# Altium footprint library ST封装.PcbLib: 1336 footprints (part 88 of 109)
Each footprint in its own frame and in the unit in brackets; x right, y up, seen from the top. Pads: shape width x height; smd on the part's side, far side on the other; paste and mask are expansions set on the pad; w line width, h text height; cw(c..) or ccw(c..) is an arc to the next point about the centre after c.
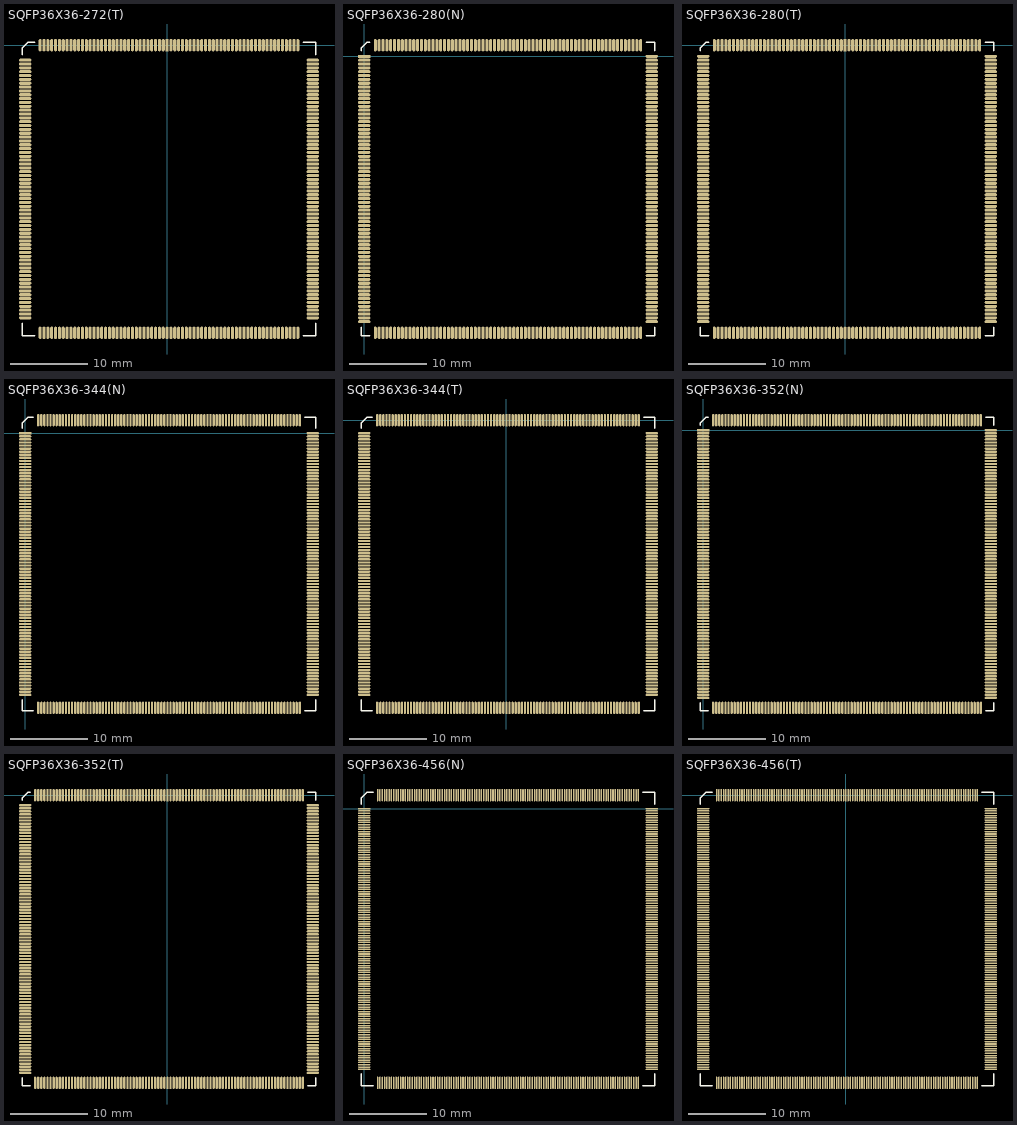
[diagram p87: the footprints below, top view; thin cyan lines are the x and y axes]

## SQFP36X36-272(T) [mm]
pads (272):
  rect 0.4x1.6 smd: 1(0,0)
  oval 0.4x1.6 smd: 2(-0.5,0) 3(-1,0) 4(-1.5,0) 5(-2,0) 6(-2.5,0) 7(-3,0) 8(-3.5,0) 9(-4,0) 10(-4.5,0) 11(-5,0) 12(-5.5,0) 13(-6,0) 14(-6.5,0) 15(-7,0) 16(-7.5,0) 17(-8,0) 18(-8.5,0) 19(-9,0) 20(-9.5,0) 21(-10,0) 22(-10.5,0) 23(-11,0) 24(-11.5,0) 25(-12,0) 26(-12.5,0) 27(-13,0) 28(-13.5,0) 29(-14,0) 30(-14.5,0) 31(-15,0) 32(-15.5,0) 33(-16,0) 34(-16.5,0) 103(-16.5,-37.4) 104(-16,-37.4) 105(-15.5,-37.4) 106(-15,-37.4) 107(-14.5,-37.4) 108(-14,-37.4) 109(-13.5,-37.4) 110(-13,-37.4) 111(-12.5,-37.4) 112(-12,-37.4) 113(-11.5,-37.4) 114(-11,-37.4) 115(-10.5,-37.4) 116(-10,-37.4) 117(-9.5,-37.4) 118(-9,-37.4) 119(-8.5,-37.4) 120(-8,-37.4) 121(-7.5,-37.4) 122(-7,-37.4) 123(-6.5,-37.4) 124(-6,-37.4) 125(-5.5,-37.4) 126(-5,-37.4) 127(-4.5,-37.4) 128(-4,-37.4) 129(-3.5,-37.4) 130(-3,-37.4) 131(-2.5,-37.4) 132(-2,-37.4) 133(-1.5,-37.4) 134(-1,-37.4) 135(-0.5,-37.4) 136(0,-37.4) 137(0.5,-37.4) 138(1,-37.4) 139(1.5,-37.4) 140(2,-37.4) 141(2.5,-37.4) 142(3,-37.4) 143(3.5,-37.4) 144(4,-37.4) 145(4.5,-37.4) 146(5,-37.4) 147(5.5,-37.4) 148(6,-37.4) 149(6.5,-37.4) 150(7,-37.4) 151(7.5,-37.4) 152(8,-37.4) 153(8.5,-37.4) 154(9,-37.4) 155(9.5,-37.4) 156(10,-37.4) 157(10.5,-37.4) 158(11,-37.4) 159(11.5,-37.4) 160(12,-37.4) 161(12.5,-37.4) 162(13,-37.4) 163(13.5,-37.4) 164(14,-37.4) 165(14.5,-37.4) 166(15,-37.4) 167(15.5,-37.4) 168(16,-37.4) 169(16.5,-37.4) 170(17,-37.4) 239(17,0) 240(16.5,0) 241(16,0) 242(15.5,0) 243(15,0) 244(14.5,0) 245(14,0) 246(13.5,0) 247(13,0) 248(12.5,0) 249(12,0) 250(11.5,0) 251(11,0) 252(10.5,0) 253(10,0) 254(9.5,0) 255(9,0) 256(8.5,0) 257(8,0) 258(7.5,0) 259(7,0) 260(6.5,0) 261(6,0) 262(5.5,0) 263(5,0) 264(4.5,0) 265(4,0) 266(3.5,0) 267(3,0) 268(2.5,0) 269(2,0) 270(1.5,0) 271(1,0) 272(0.5,0)
  oval 1.6x0.4 smd: 35(-18.45,-1.95) 36(-18.45,-2.45) 37(-18.45,-2.95) 38(-18.45,-3.45) 39(-18.45,-3.95) 40(-18.45,-4.45) 41(-18.45,-4.95) 42(-18.45,-5.45) 43(-18.45,-5.95) 44(-18.45,-6.45) 45(-18.45,-6.95) 46(-18.45,-7.45) 47(-18.45,-7.95) 48(-18.45,-8.45) 49(-18.45,-8.95) 50(-18.45,-9.45) 51(-18.45,-9.95) 52(-18.45,-10.45) 53(-18.45,-10.95) 54(-18.45,-11.45) 55(-18.45,-11.95) 56(-18.45,-12.45) 57(-18.45,-12.95) 58(-18.45,-13.45) 59(-18.45,-13.95) 60(-18.45,-14.45) 61(-18.45,-14.95) 62(-18.45,-15.45) 63(-18.45,-15.95) 64(-18.45,-16.45) 65(-18.45,-16.95) 66(-18.45,-17.45) 67(-18.45,-17.95) 68(-18.45,-18.45) 69(-18.45,-18.95) 70(-18.45,-19.45) 71(-18.45,-19.95) 72(-18.45,-20.45) 73(-18.45,-20.95) 74(-18.45,-21.45) 75(-18.45,-21.95) 76(-18.45,-22.45) 77(-18.45,-22.95) 78(-18.45,-23.45) 79(-18.45,-23.95) 80(-18.45,-24.45) 81(-18.45,-24.95) 82(-18.45,-25.45) 83(-18.45,-25.95) 84(-18.45,-26.45) 85(-18.45,-26.95) 86(-18.45,-27.45) 87(-18.45,-27.95) 88(-18.45,-28.45) 89(-18.45,-28.95) 90(-18.45,-29.45) 91(-18.45,-29.95) 92(-18.45,-30.45) 93(-18.45,-30.95) 94(-18.45,-31.45) 95(-18.45,-31.95) 96(-18.45,-32.45) 97(-18.45,-32.95) 98(-18.45,-33.45) 99(-18.45,-33.95) 100(-18.45,-34.45) 101(-18.45,-34.95) 102(-18.45,-35.45) 171(18.95,-35.45) 172(18.95,-34.95) 173(18.95,-34.45) 174(18.95,-33.95) 175(18.95,-33.45) 176(18.95,-32.95) 177(18.95,-32.45) 178(18.95,-31.95) 179(18.95,-31.45) 180(18.95,-30.95) 181(18.95,-30.45) 182(18.95,-29.95) 183(18.95,-29.45) 184(18.95,-28.95) 185(18.95,-28.45) 186(18.95,-27.95) 187(18.95,-27.45) 188(18.95,-26.95) 189(18.95,-26.45) 190(18.95,-25.95) 191(18.95,-25.45) 192(18.95,-24.95) 193(18.95,-24.45) 194(18.95,-23.95) 195(18.95,-23.45) 196(18.95,-22.95) 197(18.95,-22.45) 198(18.95,-21.95) 199(18.95,-21.45) 200(18.95,-20.95) 201(18.95,-20.45) 202(18.95,-19.95) 203(18.95,-19.45) 204(18.95,-18.95) 205(18.95,-18.45) 206(18.95,-17.95) 207(18.95,-17.45) 208(18.95,-16.95) 209(18.95,-16.45) 210(18.95,-15.95) 211(18.95,-15.45) 212(18.95,-14.95) 213(18.95,-14.45) 214(18.95,-13.95) 215(18.95,-13.45) 216(18.95,-12.95) 217(18.95,-12.45) 218(18.95,-11.95) 219(18.95,-11.45) 220(18.95,-10.95) 221(18.95,-10.45) 222(18.95,-9.95) 223(18.95,-9.45) 224(18.95,-8.95) 225(18.95,-8.45) 226(18.95,-7.95) 227(18.95,-7.45) 228(18.95,-6.95) 229(18.95,-6.45) 230(18.95,-5.95) 231(18.95,-5.45) 232(18.95,-4.95) 233(18.95,-4.45) 234(18.95,-3.95) 235(18.95,-3.45) 236(18.95,-2.95) 237(18.95,-2.45) 238(18.95,-1.95)
Top Overlay:
  lines w0.2: -18.85,-36.15 -18.85,-37.8 -17.2,-37.8 ; -18.85,-1.25 -18.85,-0.4 -18.05,0.4 -17.2,0.4 ; 17.7,-37.8 19.35,-37.8 19.35,-36.15 ; 17.7,0.4 19.35,0.4 19.35,-1.25

## SQFP36X36-280(N) [mm]
pads (280):
  rect 1.6x0.4 smd: 1(0,0)
  oval 1.6x0.4 smd: 2(0,-0.5) 3(0,-1) 4(0,-1.5) 5(0,-2) 6(0,-2.5) 7(0,-3) 8(0,-3.5) 9(0,-4) 10(0,-4.5) 11(0,-5) 12(0,-5.5) 13(0,-6) 14(0,-6.5) 15(0,-7) 16(0,-7.5) 17(0,-8) 18(0,-8.5) 19(0,-9) 20(0,-9.5) 21(0,-10) 22(0,-10.5) 23(0,-11) 24(0,-11.5) 25(0,-12) 26(0,-12.5) 27(0,-13) 28(0,-13.5) 29(0,-14) 30(0,-14.5) 31(0,-15) 32(0,-15.5) 33(0,-16) 34(0,-16.5) 35(0,-17) 36(0,-17.5) 37(0,-18) 38(0,-18.5) 39(0,-19) 40(0,-19.5) 41(0,-20) 42(0,-20.5) 43(0,-21) 44(0,-21.5) 45(0,-22) 46(0,-22.5) 47(0,-23) 48(0,-23.5) 49(0,-24) 50(0,-24.5) 51(0,-25) 52(0,-25.5) 53(0,-26) 54(0,-26.5) 55(0,-27) 56(0,-27.5) 57(0,-28) 58(0,-28.5) 59(0,-29) 60(0,-29.5) 61(0,-30) 62(0,-30.5) 63(0,-31) 64(0,-31.5) 65(0,-32) 66(0,-32.5) 67(0,-33) 68(0,-33.5) 69(0,-34) 70(0,-34.5) 141(37.4,-34.5) 142(37.4,-34) 143(37.4,-33.5) 144(37.4,-33) 145(37.4,-32.5) 146(37.4,-32) 147(37.4,-31.5) 148(37.4,-31) 149(37.4,-30.5) 150(37.4,-30) 151(37.4,-29.5) 152(37.4,-29) 153(37.4,-28.5) 154(37.4,-28) 155(37.4,-27.5) 156(37.4,-27) 157(37.4,-26.5) 158(37.4,-26) 159(37.4,-25.5) 160(37.4,-25) 161(37.4,-24.5) 162(37.4,-24) 163(37.4,-23.5) 164(37.4,-23) 165(37.4,-22.5) 166(37.4,-22) 167(37.4,-21.5) 168(37.4,-21) 169(37.4,-20.5) 170(37.4,-20) 171(37.4,-19.5) 172(37.4,-19) 173(37.4,-18.5) 174(37.4,-18) 175(37.4,-17.5) 176(37.4,-17) 177(37.4,-16.5) 178(37.4,-16) 179(37.4,-15.5) 180(37.4,-15) 181(37.4,-14.5) 182(37.4,-14) 183(37.4,-13.5) 184(37.4,-13) 185(37.4,-12.5) 186(37.4,-12) 187(37.4,-11.5) 188(37.4,-11) 189(37.4,-10.5) 190(37.4,-10) 191(37.4,-9.5) 192(37.4,-9) 193(37.4,-8.5) 194(37.4,-8) 195(37.4,-7.5) 196(37.4,-7) 197(37.4,-6.5) 198(37.4,-6) 199(37.4,-5.5) 200(37.4,-5) 201(37.4,-4.5) 202(37.4,-4) 203(37.4,-3.5) 204(37.4,-3) 205(37.4,-2.5) 206(37.4,-2) 207(37.4,-1.5) 208(37.4,-1) 209(37.4,-0.5) 210(37.4,0)
  oval 0.4x1.6 smd: 71(1.45,-35.95) 72(1.95,-35.95) 73(2.45,-35.95) 74(2.95,-35.95) 75(3.45,-35.95) 76(3.95,-35.95) 77(4.45,-35.95) 78(4.95,-35.95) 79(5.45,-35.95) 80(5.95,-35.95) 81(6.45,-35.95) 82(6.95,-35.95) 83(7.45,-35.95) 84(7.95,-35.95) 85(8.45,-35.95) 86(8.95,-35.95) 87(9.45,-35.95) 88(9.95,-35.95) 89(10.45,-35.95) 90(10.95,-35.95) 91(11.45,-35.95) 92(11.95,-35.95) 93(12.45,-35.95) 94(12.95,-35.95) 95(13.45,-35.95) 96(13.95,-35.95) 97(14.45,-35.95) 98(14.95,-35.95) 99(15.45,-35.95) 100(15.95,-35.95) 101(16.45,-35.95) 102(16.95,-35.95) 103(17.45,-35.95) 104(17.95,-35.95) 105(18.45,-35.95) 106(18.95,-35.95) 107(19.45,-35.95) 108(19.95,-35.95) 109(20.45,-35.95) 110(20.95,-35.95) 111(21.45,-35.95) 112(21.95,-35.95) 113(22.45,-35.95) 114(22.95,-35.95) 115(23.45,-35.95) 116(23.95,-35.95) 117(24.45,-35.95) 118(24.95,-35.95) 119(25.45,-35.95) 120(25.95,-35.95) 121(26.45,-35.95) 122(26.95,-35.95) 123(27.45,-35.95) 124(27.95,-35.95) 125(28.45,-35.95) 126(28.95,-35.95) 127(29.45,-35.95) 128(29.95,-35.95) 129(30.45,-35.95) 130(30.95,-35.95) 131(31.45,-35.95) 132(31.95,-35.95) 133(32.45,-35.95) 134(32.95,-35.95) 135(33.45,-35.95) 136(33.95,-35.95) 137(34.45,-35.95) 138(34.95,-35.95) 139(35.45,-35.95) 140(35.95,-35.95) 211(35.95,1.45) 212(35.45,1.45) 213(34.95,1.45) 214(34.45,1.45) 215(33.95,1.45) 216(33.45,1.45) 217(32.95,1.45) 218(32.45,1.45) 219(31.95,1.45) 220(31.45,1.45) 221(30.95,1.45) 222(30.45,1.45) 223(29.95,1.45) 224(29.45,1.45) 225(28.95,1.45) 226(28.45,1.45) 227(27.95,1.45) 228(27.45,1.45) 229(26.95,1.45) 230(26.45,1.45) 231(25.95,1.45) 232(25.45,1.45) 233(24.95,1.45) 234(24.45,1.45) 235(23.95,1.45) 236(23.45,1.45) 237(22.95,1.45) 238(22.45,1.45) 239(21.95,1.45) 240(21.45,1.45) 241(20.95,1.45) 242(20.45,1.45) 243(19.95,1.45) 244(19.45,1.45) 245(18.95,1.45) 246(18.45,1.45) 247(17.95,1.45) 248(17.45,1.45) 249(16.95,1.45) 250(16.45,1.45) 251(15.95,1.45) 252(15.45,1.45) 253(14.95,1.45) 254(14.45,1.45) 255(13.95,1.45) 256(13.45,1.45) 257(12.95,1.45) 258(12.45,1.45) 259(11.95,1.45) 260(11.45,1.45) 261(10.95,1.45) 262(10.45,1.45) 263(9.95,1.45) 264(9.45,1.45) 265(8.95,1.45) 266(8.45,1.45) 267(7.95,1.45) 268(7.45,1.45) 269(6.95,1.45) 270(6.45,1.45) 271(5.95,1.45) 272(5.45,1.45) 273(4.95,1.45) 274(4.45,1.45) 275(3.95,1.45) 276(3.45,1.45) 277(2.95,1.45) 278(2.45,1.45) 279(1.95,1.45) 280(1.45,1.45)
Top Overlay:
  lines w0.2: -0.4,-35.2 -0.4,-36.35 0.75,-36.35 ; -0.4,0.7 -0.4,1.05 0.4,1.85 0.75,1.85 ; 36.65,-36.35 37.8,-36.35 37.8,-35.2 ; 36.65,1.85 37.8,1.85 37.8,0.7

## SQFP36X36-280(T) [mm]
pads (280):
  rect 0.4x1.6 smd: 1(0,0)
  oval 0.4x1.6 smd: 2(-0.5,0) 3(-1,0) 4(-1.5,0) 5(-2,0) 6(-2.5,0) 7(-3,0) 8(-3.5,0) 9(-4,0) 10(-4.5,0) 11(-5,0) 12(-5.5,0) 13(-6,0) 14(-6.5,0) 15(-7,0) 16(-7.5,0) 17(-8,0) 18(-8.5,0) 19(-9,0) 20(-9.5,0) 21(-10,0) 22(-10.5,0) 23(-11,0) 24(-11.5,0) 25(-12,0) 26(-12.5,0) 27(-13,0) 28(-13.5,0) 29(-14,0) 30(-14.5,0) 31(-15,0) 32(-15.5,0) 33(-16,0) 34(-16.5,0) 35(-17,0) 106(-17,-37.4) 107(-16.5,-37.4) 108(-16,-37.4) 109(-15.5,-37.4) 110(-15,-37.4) 111(-14.5,-37.4) 112(-14,-37.4) 113(-13.5,-37.4) 114(-13,-37.4) 115(-12.5,-37.4) 116(-12,-37.4) 117(-11.5,-37.4) 118(-11,-37.4) 119(-10.5,-37.4) 120(-10,-37.4) 121(-9.5,-37.4) 122(-9,-37.4) 123(-8.5,-37.4) 124(-8,-37.4) 125(-7.5,-37.4) 126(-7,-37.4) 127(-6.5,-37.4) 128(-6,-37.4) 129(-5.5,-37.4) 130(-5,-37.4) 131(-4.5,-37.4) 132(-4,-37.4) 133(-3.5,-37.4) 134(-3,-37.4) 135(-2.5,-37.4) 136(-2,-37.4) 137(-1.5,-37.4) 138(-1,-37.4) 139(-0.5,-37.4) 140(0,-37.4) 141(0.5,-37.4) 142(1,-37.4) 143(1.5,-37.4) 144(2,-37.4) 145(2.5,-37.4) 146(3,-37.4) 147(3.5,-37.4) 148(4,-37.4) 149(4.5,-37.4) 150(5,-37.4) 151(5.5,-37.4) 152(6,-37.4) 153(6.5,-37.4) 154(7,-37.4) 155(7.5,-37.4) 156(8,-37.4) 157(8.5,-37.4) 158(9,-37.4) 159(9.5,-37.4) 160(10,-37.4) 161(10.5,-37.4) 162(11,-37.4) 163(11.5,-37.4) 164(12,-37.4) 165(12.5,-37.4) 166(13,-37.4) 167(13.5,-37.4) 168(14,-37.4) 169(14.5,-37.4) 170(15,-37.4) 171(15.5,-37.4) 172(16,-37.4) 173(16.5,-37.4) 174(17,-37.4) 175(17.5,-37.4) 246(17.5,0) 247(17,0) 248(16.5,0) 249(16,0) 250(15.5,0) 251(15,0) 252(14.5,0) 253(14,0) 254(13.5,0) 255(13,0) 256(12.5,0) 257(12,0) 258(11.5,0) 259(11,0) 260(10.5,0) 261(10,0) 262(9.5,0) 263(9,0) 264(8.5,0) 265(8,0) 266(7.5,0) 267(7,0) 268(6.5,0) 269(6,0) 270(5.5,0) 271(5,0) 272(4.5,0) 273(4,0) 274(3.5,0) 275(3,0) 276(2.5,0) 277(2,0) 278(1.5,0) 279(1,0) 280(0.5,0)
  oval 1.6x0.4 smd: 36(-18.45,-1.45) 37(-18.45,-1.95) 38(-18.45,-2.45) 39(-18.45,-2.95) 40(-18.45,-3.45) 41(-18.45,-3.95) 42(-18.45,-4.45) 43(-18.45,-4.95) 44(-18.45,-5.45) 45(-18.45,-5.95) 46(-18.45,-6.45) 47(-18.45,-6.95) 48(-18.45,-7.45) 49(-18.45,-7.95) 50(-18.45,-8.45) 51(-18.45,-8.95) 52(-18.45,-9.45) 53(-18.45,-9.95) 54(-18.45,-10.45) 55(-18.45,-10.95) 56(-18.45,-11.45) 57(-18.45,-11.95) 58(-18.45,-12.45) 59(-18.45,-12.95) 60(-18.45,-13.45) 61(-18.45,-13.95) 62(-18.45,-14.45) 63(-18.45,-14.95) 64(-18.45,-15.45) 65(-18.45,-15.95) 66(-18.45,-16.45) 67(-18.45,-16.95) 68(-18.45,-17.45) 69(-18.45,-17.95) 70(-18.45,-18.45) 71(-18.45,-18.95) 72(-18.45,-19.45) 73(-18.45,-19.95) 74(-18.45,-20.45) 75(-18.45,-20.95) 76(-18.45,-21.45) 77(-18.45,-21.95) 78(-18.45,-22.45) 79(-18.45,-22.95) 80(-18.45,-23.45) 81(-18.45,-23.95) 82(-18.45,-24.45) 83(-18.45,-24.95) 84(-18.45,-25.45) 85(-18.45,-25.95) 86(-18.45,-26.45) 87(-18.45,-26.95) 88(-18.45,-27.45) 89(-18.45,-27.95) 90(-18.45,-28.45) 91(-18.45,-28.95) 92(-18.45,-29.45) 93(-18.45,-29.95) 94(-18.45,-30.45) 95(-18.45,-30.95) 96(-18.45,-31.45) 97(-18.45,-31.95) 98(-18.45,-32.45) 99(-18.45,-32.95) 100(-18.45,-33.45) 101(-18.45,-33.95) 102(-18.45,-34.45) 103(-18.45,-34.95) 104(-18.45,-35.45) 105(-18.45,-35.95) 176(18.95,-35.95) 177(18.95,-35.45) 178(18.95,-34.95) 179(18.95,-34.45) 180(18.95,-33.95) 181(18.95,-33.45) 182(18.95,-32.95) 183(18.95,-32.45) 184(18.95,-31.95) 185(18.95,-31.45) 186(18.95,-30.95) 187(18.95,-30.45) 188(18.95,-29.95) 189(18.95,-29.45) 190(18.95,-28.95) 191(18.95,-28.45) 192(18.95,-27.95) 193(18.95,-27.45) 194(18.95,-26.95) 195(18.95,-26.45) 196(18.95,-25.95) 197(18.95,-25.45) 198(18.95,-24.95) 199(18.95,-24.45) 200(18.95,-23.95) 201(18.95,-23.45) 202(18.95,-22.95) 203(18.95,-22.45) 204(18.95,-21.95) 205(18.95,-21.45) 206(18.95,-20.95) 207(18.95,-20.45) 208(18.95,-19.95) 209(18.95,-19.45) 210(18.95,-18.95) 211(18.95,-18.45) 212(18.95,-17.95) 213(18.95,-17.45) 214(18.95,-16.95) 215(18.95,-16.45) 216(18.95,-15.95) 217(18.95,-15.45) 218(18.95,-14.95) 219(18.95,-14.45) 220(18.95,-13.95) 221(18.95,-13.45) 222(18.95,-12.95) 223(18.95,-12.45) 224(18.95,-11.95) 225(18.95,-11.45) 226(18.95,-10.95) 227(18.95,-10.45) 228(18.95,-9.95) 229(18.95,-9.45) 230(18.95,-8.95) 231(18.95,-8.45) 232(18.95,-7.95) 233(18.95,-7.45) 234(18.95,-6.95) 235(18.95,-6.45) 236(18.95,-5.95) 237(18.95,-5.45) 238(18.95,-4.95) 239(18.95,-4.45) 240(18.95,-3.95) 241(18.95,-3.45) 242(18.95,-2.95) 243(18.95,-2.45) 244(18.95,-1.95) 245(18.95,-1.45)
Top Overlay:
  lines w0.2: -18.85,-36.65 -18.85,-37.8 -17.7,-37.8 ; -18.85,-0.75 -18.85,-0.4 -18.05,0.4 -17.7,0.4 ; 18.2,-37.8 19.35,-37.8 19.35,-36.65 ; 18.2,0.4 19.35,0.4 19.35,-0.75

## SQFP36X36-344(N) [mm]
pads (344):
  rect 1.6x0.3 smd: 1(0,0)
  oval 1.6x0.3 smd: 2(0,-0.4) 3(0,-0.8) 4(0,-1.2) 5(0,-1.6) 6(0,-2) 7(0,-2.4) 8(0,-2.8) 9(0,-3.2) 10(0,-3.6) 11(0,-4) 12(0,-4.4) 13(0,-4.8) 14(0,-5.2) 15(0,-5.6) 16(0,-6) 17(0,-6.4) 18(0,-6.8) 19(0,-7.2) 20(0,-7.6) 21(0,-8) 22(0,-8.4) 23(0,-8.8) 24(0,-9.2) 25(0,-9.6) 26(0,-10) 27(0,-10.4) 28(0,-10.8) 29(0,-11.2) 30(0,-11.6) 31(0,-12) 32(0,-12.4) 33(0,-12.8) 34(0,-13.2) 35(0,-13.6) 36(0,-14) 37(0,-14.4) 38(0,-14.8) 39(0,-15.2) 40(0,-15.6) 41(0,-16) 42(0,-16.4) 43(0,-16.8) 44(0,-17.2) 45(0,-17.6) 46(0,-18) 47(0,-18.4) 48(0,-18.8) 49(0,-19.2) 50(0,-19.6) 51(0,-20) 52(0,-20.4) 53(0,-20.8) 54(0,-21.2) 55(0,-21.6) 56(0,-22) 57(0,-22.4) 58(0,-22.8) 59(0,-23.2) 60(0,-23.6) 61(0,-24) 62(0,-24.4) 63(0,-24.8) 64(0,-25.2) 65(0,-25.6) 66(0,-26) 67(0,-26.4) 68(0,-26.8) 69(0,-27.2) 70(0,-27.6) 71(0,-28) 72(0,-28.4) 73(0,-28.8) 74(0,-29.2) 75(0,-29.6) 76(0,-30) 77(0,-30.4) 78(0,-30.8) 79(0,-31.2) 80(0,-31.6) 81(0,-32) 82(0,-32.4) 83(0,-32.8) 84(0,-33.2) 85(0,-33.6) 86(0,-34) 173(37.4,-34) 174(37.4,-33.6) 175(37.4,-33.2) 176(37.4,-32.8) 177(37.4,-32.4) 178(37.4,-32) 179(37.4,-31.6) 180(37.4,-31.2) 181(37.4,-30.8) 182(37.4,-30.4) 183(37.4,-30) 184(37.4,-29.6) 185(37.4,-29.2) 186(37.4,-28.8) 187(37.4,-28.4) 188(37.4,-28) 189(37.4,-27.6) 190(37.4,-27.2) 191(37.4,-26.8) 192(37.4,-26.4) 193(37.4,-26) 194(37.4,-25.6) 195(37.4,-25.2) 196(37.4,-24.8) 197(37.4,-24.4) 198(37.4,-24) 199(37.4,-23.6) 200(37.4,-23.2) 201(37.4,-22.8) 202(37.4,-22.4) 203(37.4,-22) 204(37.4,-21.6) 205(37.4,-21.2) 206(37.4,-20.8) 207(37.4,-20.4) 208(37.4,-20) 209(37.4,-19.6) 210(37.4,-19.2) 211(37.4,-18.8) 212(37.4,-18.4) 213(37.4,-18) 214(37.4,-17.6) 215(37.4,-17.2) 216(37.4,-16.8) 217(37.4,-16.4) 218(37.4,-16) 219(37.4,-15.6) 220(37.4,-15.2) 221(37.4,-14.8) 222(37.4,-14.4) 223(37.4,-14) 224(37.4,-13.6) 225(37.4,-13.2) 226(37.4,-12.8) 227(37.4,-12.4) 228(37.4,-12) 229(37.4,-11.6) 230(37.4,-11.2) 231(37.4,-10.8) 232(37.4,-10.4) 233(37.4,-10) 234(37.4,-9.6) 235(37.4,-9.2) 236(37.4,-8.8) 237(37.4,-8.4) 238(37.4,-8) 239(37.4,-7.6) 240(37.4,-7.2) 241(37.4,-6.8) 242(37.4,-6.4) 243(37.4,-6) 244(37.4,-5.6) 245(37.4,-5.2) 246(37.4,-4.8) 247(37.4,-4.4) 248(37.4,-4) 249(37.4,-3.6) 250(37.4,-3.2) 251(37.4,-2.8) 252(37.4,-2.4) 253(37.4,-2) 254(37.4,-1.6) 255(37.4,-1.2) 256(37.4,-0.8) 257(37.4,-0.4) 258(37.4,0)
  oval 0.3x1.6 smd: 87(1.7,-35.7) 88(2.1,-35.7) 89(2.5,-35.7) 90(2.9,-35.7) 91(3.3,-35.7) 92(3.7,-35.7) 93(4.1,-35.7) 94(4.5,-35.7) 95(4.9,-35.7) 96(5.3,-35.7) 97(5.7,-35.7) 98(6.1,-35.7) 99(6.5,-35.7) 100(6.9,-35.7) 101(7.3,-35.7) 102(7.7,-35.7) 103(8.1,-35.7) 104(8.5,-35.7) 105(8.9,-35.7) 106(9.3,-35.7) 107(9.7,-35.7) 108(10.1,-35.7) 109(10.5,-35.7) 110(10.9,-35.7) 111(11.3,-35.7) 112(11.7,-35.7) 113(12.1,-35.7) 114(12.5,-35.7) 115(12.9,-35.7) 116(13.3,-35.7) 117(13.7,-35.7) 118(14.1,-35.7) 119(14.5,-35.7) 120(14.9,-35.7) 121(15.3,-35.7) 122(15.7,-35.7) 123(16.1,-35.7) 124(16.5,-35.7) 125(16.9,-35.7) 126(17.3,-35.7) 127(17.7,-35.7) 128(18.1,-35.7) 129(18.5,-35.7) 130(18.9,-35.7) 131(19.3,-35.7) 132(19.7,-35.7) 133(20.1,-35.7) 134(20.5,-35.7) 135(20.9,-35.7) 136(21.3,-35.7) 137(21.7,-35.7) 138(22.1,-35.7) 139(22.5,-35.7) 140(22.9,-35.7) 141(23.3,-35.7) 142(23.7,-35.7) 143(24.1,-35.7) 144(24.5,-35.7) 145(24.9,-35.7) 146(25.3,-35.7) 147(25.7,-35.7) 148(26.1,-35.7) 149(26.5,-35.7) 150(26.9,-35.7) 151(27.3,-35.7) 152(27.7,-35.7) 153(28.1,-35.7) 154(28.5,-35.7) 155(28.9,-35.7) 156(29.3,-35.7) 157(29.7,-35.7) 158(30.1,-35.7) 159(30.5,-35.7) 160(30.9,-35.7) 161(31.3,-35.7) 162(31.7,-35.7) 163(32.1,-35.7) 164(32.5,-35.7) 165(32.9,-35.7) 166(33.3,-35.7) 167(33.7,-35.7) 168(34.1,-35.7) 169(34.5,-35.7) 170(34.9,-35.7) 171(35.3,-35.7) 172(35.7,-35.7) 259(35.7,1.7) 260(35.3,1.7) 261(34.9,1.7) 262(34.5,1.7) 263(34.1,1.7) 264(33.7,1.7) 265(33.3,1.7) 266(32.9,1.7) 267(32.5,1.7) 268(32.1,1.7) 269(31.7,1.7) 270(31.3,1.7) 271(30.9,1.7) 272(30.5,1.7) 273(30.1,1.7) 274(29.7,1.7) 275(29.3,1.7) 276(28.9,1.7) 277(28.5,1.7) 278(28.1,1.7) 279(27.7,1.7) 280(27.3,1.7) 281(26.9,1.7) 282(26.5,1.7) 283(26.1,1.7) 284(25.7,1.7) 285(25.3,1.7) 286(24.9,1.7) 287(24.5,1.7) 288(24.1,1.7) 289(23.7,1.7) 290(23.3,1.7) 291(22.9,1.7) 292(22.5,1.7) 293(22.1,1.7) 294(21.7,1.7) 295(21.3,1.7) 296(20.9,1.7) 297(20.5,1.7) 298(20.1,1.7) 299(19.7,1.7) 300(19.3,1.7) 301(18.9,1.7) 302(18.5,1.7) 303(18.1,1.7) 304(17.7,1.7) 305(17.3,1.7) 306(16.9,1.7) 307(16.5,1.7) 308(16.1,1.7) 309(15.7,1.7) 310(15.3,1.7) 311(14.9,1.7) 312(14.5,1.7) 313(14.1,1.7) 314(13.7,1.7) 315(13.3,1.7) 316(12.9,1.7) 317(12.5,1.7) 318(12.1,1.7) 319(11.7,1.7) 320(11.3,1.7) 321(10.9,1.7) 322(10.5,1.7) 323(10.1,1.7) 324(9.7,1.7) 325(9.3,1.7) 326(8.9,1.7) 327(8.5,1.7) 328(8.1,1.7) 329(7.7,1.7) 330(7.3,1.7) 331(6.9,1.7) 332(6.5,1.7) 333(6.1,1.7) 334(5.7,1.7) 335(5.3,1.7) 336(4.9,1.7) 337(4.5,1.7) 338(4.1,1.7) 339(3.7,1.7) 340(3.3,1.7) 341(2.9,1.7) 342(2.5,1.7) 343(2.1,1.7) 344(1.7,1.7)
Top Overlay:
  lines w0.2: -0.4,-34.65 -0.4,-36.1 1.05,-36.1 ; -0.4,0.65 -0.4,1.3 0.4,2.1 1.05,2.1 ; 36.35,-36.1 37.8,-36.1 37.8,-34.65 ; 36.35,2.1 37.8,2.1 37.8,0.65

## SQFP36X36-344(T) [mm]
pads (344):
  rect 0.3x1.6 smd: 1(0,0)
  oval 0.3x1.6 smd: 2(-0.4,0) 3(-0.8,0) 4(-1.2,0) 5(-1.6,0) 6(-2,0) 7(-2.4,0) 8(-2.8,0) 9(-3.2,0) 10(-3.6,0) 11(-4,0) 12(-4.4,0) 13(-4.8,0) 14(-5.2,0) 15(-5.6,0) 16(-6,0) 17(-6.4,0) 18(-6.8,0) 19(-7.2,0) 20(-7.6,0) 21(-8,0) 22(-8.4,0) 23(-8.8,0) 24(-9.2,0) 25(-9.6,0) 26(-10,0) 27(-10.4,0) 28(-10.8,0) 29(-11.2,0) 30(-11.6,0) 31(-12,0) 32(-12.4,0) 33(-12.8,0) 34(-13.2,0) 35(-13.6,0) 36(-14,0) 37(-14.4,0) 38(-14.8,0) 39(-15.2,0) 40(-15.6,0) 41(-16,0) 42(-16.4,0) 43(-16.8,0) 130(-16.8,-37.4) 131(-16.4,-37.4) 132(-16,-37.4) 133(-15.6,-37.4) 134(-15.2,-37.4) 135(-14.8,-37.4) 136(-14.4,-37.4) 137(-14,-37.4) 138(-13.6,-37.4) 139(-13.2,-37.4) 140(-12.8,-37.4) 141(-12.4,-37.4) 142(-12,-37.4) 143(-11.6,-37.4) 144(-11.2,-37.4) 145(-10.8,-37.4) 146(-10.4,-37.4) 147(-10,-37.4) 148(-9.6,-37.4) 149(-9.2,-37.4) 150(-8.8,-37.4) 151(-8.4,-37.4) 152(-8,-37.4) 153(-7.6,-37.4) 154(-7.2,-37.4) 155(-6.8,-37.4) 156(-6.4,-37.4) 157(-6,-37.4) 158(-5.6,-37.4) 159(-5.2,-37.4) 160(-4.8,-37.4) 161(-4.4,-37.4) 162(-4,-37.4) 163(-3.6,-37.4) 164(-3.2,-37.4) 165(-2.8,-37.4) 166(-2.4,-37.4) 167(-2,-37.4) 168(-1.6,-37.4) 169(-1.2,-37.4) 170(-0.8,-37.4) 171(-0.4,-37.4) 172(0,-37.4) 173(0.4,-37.4) 174(0.8,-37.4) 175(1.2,-37.4) 176(1.6,-37.4) 177(2,-37.4) 178(2.4,-37.4) 179(2.8,-37.4) 180(3.2,-37.4) 181(3.6,-37.4) 182(4,-37.4) 183(4.4,-37.4) 184(4.8,-37.4) 185(5.2,-37.4) 186(5.6,-37.4) 187(6,-37.4) 188(6.4,-37.4) 189(6.8,-37.4) 190(7.2,-37.4) 191(7.6,-37.4) 192(8,-37.4) 193(8.4,-37.4) 194(8.8,-37.4) 195(9.2,-37.4) 196(9.6,-37.4) 197(10,-37.4) 198(10.4,-37.4) 199(10.8,-37.4) 200(11.2,-37.4) 201(11.6,-37.4) 202(12,-37.4) 203(12.4,-37.4) 204(12.8,-37.4) 205(13.2,-37.4) 206(13.6,-37.4) 207(14,-37.4) 208(14.4,-37.4) 209(14.8,-37.4) 210(15.2,-37.4) 211(15.6,-37.4) 212(16,-37.4) 213(16.4,-37.4) 214(16.8,-37.4) 215(17.2,-37.4) 302(17.2,0) 303(16.8,0) 304(16.4,0) 305(16,0) 306(15.6,0) 307(15.2,0) 308(14.8,0) 309(14.4,0) 310(14,0) 311(13.6,0) 312(13.2,0) 313(12.8,0) 314(12.4,0) 315(12,0) 316(11.6,0) 317(11.2,0) 318(10.8,0) 319(10.4,0) 320(10,0) 321(9.6,0) 322(9.2,0) 323(8.8,0) 324(8.4,0) 325(8,0) 326(7.6,0) 327(7.2,0) 328(6.8,0) 329(6.4,0) 330(6,0) 331(5.6,0) 332(5.2,0) 333(4.8,0) 334(4.4,0) 335(4,0) 336(3.6,0) 337(3.2,0) 338(2.8,0) 339(2.4,0) 340(2,0) 341(1.6,0) 342(1.2,0) 343(0.8,0) 344(0.4,0)
  oval 1.6x0.3 smd: 44(-18.5,-1.7) 45(-18.5,-2.1) 46(-18.5,-2.5) 47(-18.5,-2.9) 48(-18.5,-3.3) 49(-18.5,-3.7) 50(-18.5,-4.1) 51(-18.5,-4.5) 52(-18.5,-4.9) 53(-18.5,-5.3) 54(-18.5,-5.7) 55(-18.5,-6.1) 56(-18.5,-6.5) 57(-18.5,-6.9) 58(-18.5,-7.3) 59(-18.5,-7.7) 60(-18.5,-8.1) 61(-18.5,-8.5) 62(-18.5,-8.9) 63(-18.5,-9.3) 64(-18.5,-9.7) 65(-18.5,-10.1) 66(-18.5,-10.5) 67(-18.5,-10.9) 68(-18.5,-11.3) 69(-18.5,-11.7) 70(-18.5,-12.1) 71(-18.5,-12.5) 72(-18.5,-12.9) 73(-18.5,-13.3) 74(-18.5,-13.7) 75(-18.5,-14.1) 76(-18.5,-14.5) 77(-18.5,-14.9) 78(-18.5,-15.3) 79(-18.5,-15.7) 80(-18.5,-16.1) 81(-18.5,-16.5) 82(-18.5,-16.9) 83(-18.5,-17.3) 84(-18.5,-17.7) 85(-18.5,-18.1) 86(-18.5,-18.5) 87(-18.5,-18.9) 88(-18.5,-19.3) 89(-18.5,-19.7) 90(-18.5,-20.1) 91(-18.5,-20.5) 92(-18.5,-20.9) 93(-18.5,-21.3) 94(-18.5,-21.7) 95(-18.5,-22.1) 96(-18.5,-22.5) 97(-18.5,-22.9) 98(-18.5,-23.3) 99(-18.5,-23.7) 100(-18.5,-24.1) 101(-18.5,-24.5) 102(-18.5,-24.9) 103(-18.5,-25.3) 104(-18.5,-25.7) 105(-18.5,-26.1) 106(-18.5,-26.5) 107(-18.5,-26.9) 108(-18.5,-27.3) 109(-18.5,-27.7) 110(-18.5,-28.1) 111(-18.5,-28.5) 112(-18.5,-28.9) 113(-18.5,-29.3) 114(-18.5,-29.7) 115(-18.5,-30.1) 116(-18.5,-30.5) 117(-18.5,-30.9) 118(-18.5,-31.3) 119(-18.5,-31.7) 120(-18.5,-32.1) 121(-18.5,-32.5) 122(-18.5,-32.9) 123(-18.5,-33.3) 124(-18.5,-33.7) 125(-18.5,-34.1) 126(-18.5,-34.5) 127(-18.5,-34.9) 128(-18.5,-35.3) 129(-18.5,-35.7) 216(18.9,-35.7) 217(18.9,-35.3) 218(18.9,-34.9) 219(18.9,-34.5) 220(18.9,-34.1) 221(18.9,-33.7) 222(18.9,-33.3) 223(18.9,-32.9) 224(18.9,-32.5) 225(18.9,-32.1) 226(18.9,-31.7) 227(18.9,-31.3) 228(18.9,-30.9) 229(18.9,-30.5) 230(18.9,-30.1) 231(18.9,-29.7) 232(18.9,-29.3) 233(18.9,-28.9) 234(18.9,-28.5) 235(18.9,-28.1) 236(18.9,-27.7) 237(18.9,-27.3) 238(18.9,-26.9) 239(18.9,-26.5) 240(18.9,-26.1) 241(18.9,-25.7) 242(18.9,-25.3) 243(18.9,-24.9) 244(18.9,-24.5) 245(18.9,-24.1) 246(18.9,-23.7) 247(18.9,-23.3) 248(18.9,-22.9) 249(18.9,-22.5) 250(18.9,-22.1) 251(18.9,-21.7) 252(18.9,-21.3) 253(18.9,-20.9) 254(18.9,-20.5) 255(18.9,-20.1) 256(18.9,-19.7) 257(18.9,-19.3) 258(18.9,-18.9) 259(18.9,-18.5) 260(18.9,-18.1) 261(18.9,-17.7) 262(18.9,-17.3) 263(18.9,-16.9) 264(18.9,-16.5) 265(18.9,-16.1) 266(18.9,-15.7) 267(18.9,-15.3) 268(18.9,-14.9) 269(18.9,-14.5) 270(18.9,-14.1) 271(18.9,-13.7) 272(18.9,-13.3) 273(18.9,-12.9) 274(18.9,-12.5) 275(18.9,-12.1) 276(18.9,-11.7) 277(18.9,-11.3) 278(18.9,-10.9) 279(18.9,-10.5) 280(18.9,-10.1) 281(18.9,-9.7) 282(18.9,-9.3) 283(18.9,-8.9) 284(18.9,-8.5) 285(18.9,-8.1) 286(18.9,-7.7) 287(18.9,-7.3) 288(18.9,-6.9) 289(18.9,-6.5) 290(18.9,-6.1) 291(18.9,-5.7) 292(18.9,-5.3) 293(18.9,-4.9) 294(18.9,-4.5) 295(18.9,-4.1) 296(18.9,-3.7) 297(18.9,-3.3) 298(18.9,-2.9) 299(18.9,-2.5) 300(18.9,-2.1) 301(18.9,-1.7)